# Altium footprint library LDCN Components.PcbLib: 426 footprints (part 8 of 27)
Each footprint in its own frame and in the unit in brackets; x right, y up, seen from the top. Pads: shape width x height; smd on the part's side, far side on the other; paste and mask are expansions set on the pad; w line width, h text height; cw(c..) or ccw(c..) is an arc to the next point about the centre after c.
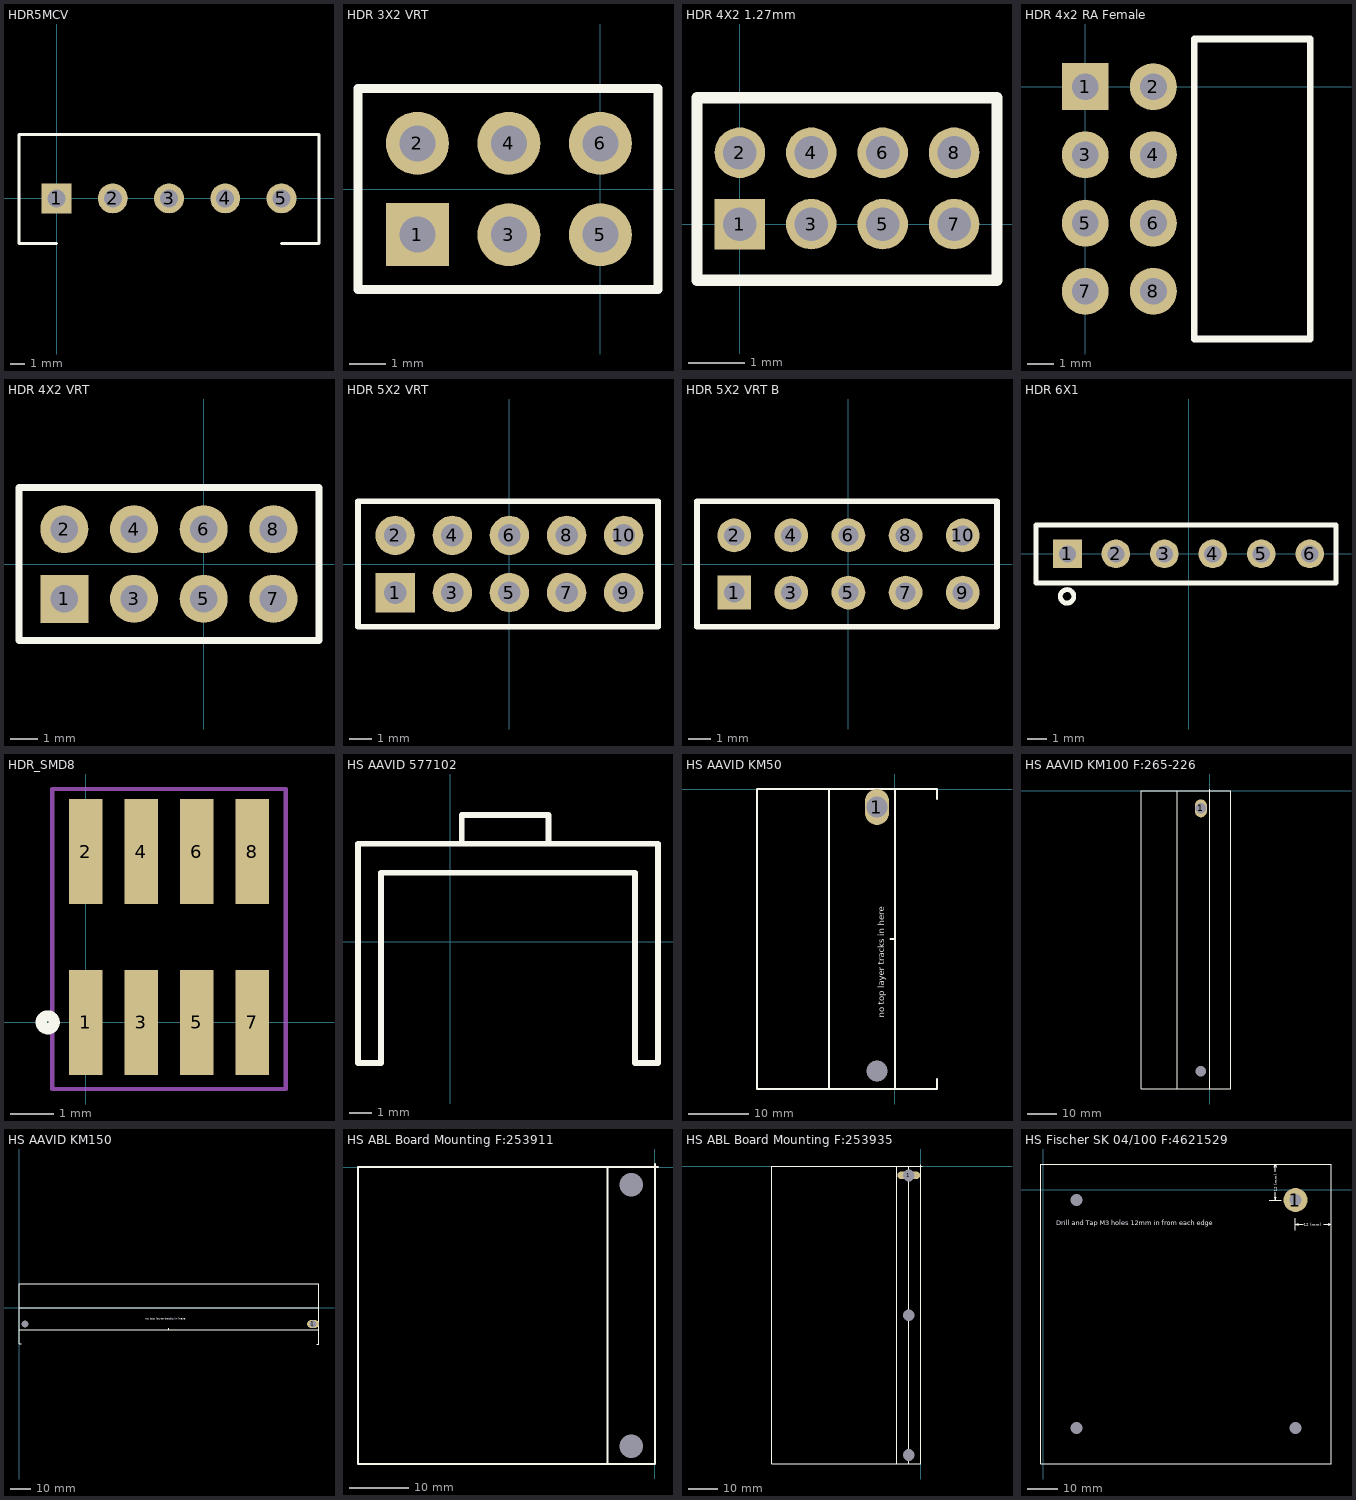
[diagram p7: the footprints below, top view; thin cyan lines are the x and y axes]

## HDR5MCV [mil] "Connector; Header MCV; 5 Position"
pads (5):
  rect 80x80 hole 48: 1(0,0)
  round 80 hole 48: 2(150,0) 3(300,0) 4(450,0) 5(600,0)
Top Overlay:
  lines w7.87: 0,-120 -100,-120 -100,170 700,170 700,-120 600,-120

## HDR 3X2 VRT [mm] "6 Way Header, 2.54mm"
height 8
pads (6):
  rect 1.75x1.75 hole 1: 1(-5.08,-1.27)
  round 1.75 hole 1: 2(-5.08,1.27) 3(-2.54,-1.27) 4(-2.54,1.27) 5(0,-1.27) 6(0,1.27)
Top Overlay:
  lines w0.254: -6.731,-2.794 -6.731,2.794 1.6,2.794 1.6,-2.794 -6.731,-2.794

## HDR 4X2 1.27mm [mm]
height 5
pads (8):
  rect 0.9x0.9 hole 0.6: 1(0,0)
  round 0.9 hole 0.6: 2(0,1.27) 3(1.27,0) 4(1.27,1.27) 5(2.54,0) 6(2.54,1.27) 7(3.81,0) 8(3.81,1.27)
Top Overlay:
  lines w0.203: 4.572,0.508 4.572,2.25 -0.762,2.25 -0.762,-1 4.572,-1 4.572,0.762

## HDR 4x2 RA Female [mm] "8 Way Header, 2mm Female"
pads (8):
  rect 1.75x1.75 hole 1: 1(0,0)
  round 1.75 hole 1: 2(2.54,0) 3(0,-2.54) 4(2.54,-2.54) 5(0,-5.08) 6(2.54,-5.08) 7(0,-7.62) 8(2.54,-7.62)
Top Overlay:
  lines w0.254: 4.064,-9.398 8.382,-9.398 8.382,1.778 4.064,1.778 4.064,-9.398

## HDR 4X2 VRT [mm] "8 Way Header, 2.54mm"
height 8
pads (8):
  rect 1.75x1.75 hole 1: 1(-5.08,-1.27)
  round 1.75 hole 1: 2(-5.08,1.27) 3(-2.54,-1.27) 4(-2.54,1.27) 5(0,-1.27) 6(0,1.27) 7(2.54,-1.27) 8(2.54,1.27)
Top Overlay:
  lines w0.254: -6.731,-2.794 -6.731,2.794 4.2,2.794 4.2,-2.794 -6.731,-2.794

## HDR 5X2 VRT [mm] "10 Way Header, 2.54mm"
height 8
pads (10):
  rect 1.75x1.75 hole 1: 1(-5.08,-1.27)
  round 1.75 hole 1: 2(-5.08,1.27) 3(-2.54,-1.27) 4(-2.54,1.27) 5(0,-1.27) 6(0,1.27) 7(2.54,-1.27) 8(2.54,1.27) 9(5.08,-1.27) 10(5.08,1.27)
Top Overlay:
  lines w0.254: -6.731,-2.794 6.604,-2.794 6.604,2.794 -6.731,2.794 -6.731,-2.794

## HDR 5X2 VRT B [mm] "10 Way Header, 2.54mm, 0.9x1.9mm Pads"
height 8
pads (10):
  rect 1.5x1.5 hole 0.9: 1(-5.08,-1.27)
  round 1.5 hole 0.9: 2(-5.08,1.27) 3(-2.54,-1.27) 4(-2.54,1.27) 5(0,-1.27) 6(0,1.27) 7(2.54,-1.27) 8(2.54,1.27) 9(5.08,-1.27) 10(5.08,1.27)
Top Overlay:
  lines w0.254: -6.731,-2.794 -6.731,2.794 6.604,2.794 6.604,-2.794 -6.731,-2.794

## HDR 6X1 [mm] "5 Way Header, 2.54mm"
height 8
pads (6):
  rect 1.5x1.5 hole 0.9: 1(-6.35,0)
  round 1.5 hole 0.9: 2(-3.81,0) 3(-1.27,0) 4(1.27,0) 5(3.81,0) 6(6.35,0)
Top Overlay:
  circle w0.254: c-6.374,-2.23 r0.354
  lines w0.254: -8.001,-1.524 -8.001,1.52 7.73,1.52 7.73,-1.524 -8.001,-1.524
3D body "User Library-Header_Male_RA_Low_6Pin.STEP": height 2.51, standoff -3, extent -7.62,-9.755 7.62,0.375

## HDR_SMD8 [mm] "1.27mm Pitch SMD Header"
height 6
pads (8):
  rect 0.76x2.4 smd: 1(0,0) 2(0,3.9) 3(1.27,0) 4(1.27,3.9) 5(2.54,0) 6(2.54,3.9) 7(3.81,0) 8(3.81,3.9)
Top Overlay:
  circle w0.254: c-0.867,0 r0.149
Mechanical 15:
  lines w0.1: -0.762,-1.524 4.572,-1.524 4.572,5.334 -0.762,5.334 -0.762,-1.524

## HS AAVID 577102 [mm] "Aavid 577102"
height 19
Top Overlay:
  lines w0.254: 0.508,4.318 0.508,5.588 4.318,5.588 4.318,4.318 ; -4.064,-5.334 -4.064,4.318 9.144,4.318 9.144,-5.334 8.128,-5.334 8.128,3.048 2.54,3.048 -3.048,3.048 -3.048,-5.334 -4.064,-5.334

## HS AAVID KM50 [mm] "F:265202"
height 45
pads (2):
  round 0 hole 3.5 unplated: 0(-3,-47)
  oval 4x6 hole 3.5: 1(-3,-3)
Top Overlay:
  lines w0.254: -11,-50 -11,0 ; -0.8,-25 0,-25 ; 0,-50 0,0 ; 7,-48.26 7,-50 -23,-50 -23,0 7,0 7,-1.74
  text "no top layer tracks in here" at -1.778,-38.1 h1.02

## HS AAVID KM100 F:265-226 [mm]
height 45
pads (2):
  round 0 hole 3.5: 0(-3,-94)
  oval 4x6 hole 3.5: 1(-3,-6)
Top Overlay:
  lines w0.305: -23,-100 7,-100 ; -23,-99.962 -23,0 7,0 7,-99.962 ; -11,-99.962 -11,0 ; 0,-99.962 0,0 0,0.508

## HS AAVID KM150 [mm]
height 45
pads (2):
  round 0 hole 3.5 unplated: 0(3,-8)
  oval 6x4 hole 3.5: 1(147,-8)
Top Overlay:
  lines w0.254: 0,-11 150,-11 ; 0,0 150,0 ; 1,-18 0,-18 0,12 150,12 150,-18 149,-18 ; 75,-11 75,-10.2
  text "no top layer tracks in here" at 63,-6 h1.02

## HS ABL Board Mounting F:253911 [mm]
pads (2):
  round 0 hole 4: 1(-4,-47) 1(-3.998,-3)
Top Overlay:
  lines w0.305: -8,-50 -8,0 ; 0,0.508 0,0 ; 0.508,0 0,0 ; 0,0 0,-50 -50,-50 -50,0 0,0

## HS ABL Board Mounting F:253935 [mm]
pads (3):
  round 0 hole 4: 0(-4,-97) 0(-3.998,-50)
  oval 7.62x2.54 hole 4: 1(-3.998,-3)
Top Overlay:
  lines w0.305: -8,-99.962 -8,0 ; -3.998,-99.962 -3.998,0 ; -0.011,-99.962 -50,-99.962 -50,0 0,0 ; 0,-99.962 0,0 ; 0,0.508 0,0 ; 0.508,0 0,0

## HS Fischer SK 04/100 F:4621529 [mm]
pads (4):
  round 1.27 hole 4: 0(11,-79.38) 0(11,-3.38) 0(84,-79.38)
  round 8 hole 4: 1(84,-3.38)
Top Overlay:
  lines w0.254: 75.242,-3.399 79.242,-3.399 ; 75.242,8.601 79.242,8.601 ; 76.909,-2.399 77.242,-3.399 ; 76.909,7.601 77.242,8.601 ; 77.242,-0.804 77.242,-3.399 ; 77.242,6.006 77.242,8.601 ; 77.575,-2.399 77.242,-3.399 ; 77.575,7.601 77.242,8.601 ; 83.976,-13.492 83.976,-9.492 ; 84.976,-11.825 83.976,-11.492 ; 84.976,-11.159 83.976,-11.492 ; 86.571,-11.492 83.976,-11.492 ; 93.381,-11.492 95.976,-11.492 ; 94.976,-11.825 95.976,-11.492 ; 94.976,-11.159 95.976,-11.492 ; 95.976,-13.492 95.976,-9.492 ; -1,-91.38 -1,8.62 96,8.62 96,-91.38 -1,-91.38
  text "12 (mm)" at 77.894,-0.55 h1
  text "12 (mm)" at 86.825,-12.144 h1
  text "Drill and Tap M3 holes 12mm in from each edge" at 4.25,-11.75 h1.52